# Altium footprint library Supernova.PcbLib: 77 footprints (part 4 of 6)
Each footprint in its own frame and in the unit in brackets; x right, y up, seen from the top. Pads: shape width x height; smd on the part's side, far side on the other; paste and mask are expansions set on the pad; w line width, h text height; cw(c..) or ccw(c..) is an arc to the next point about the centre after c.
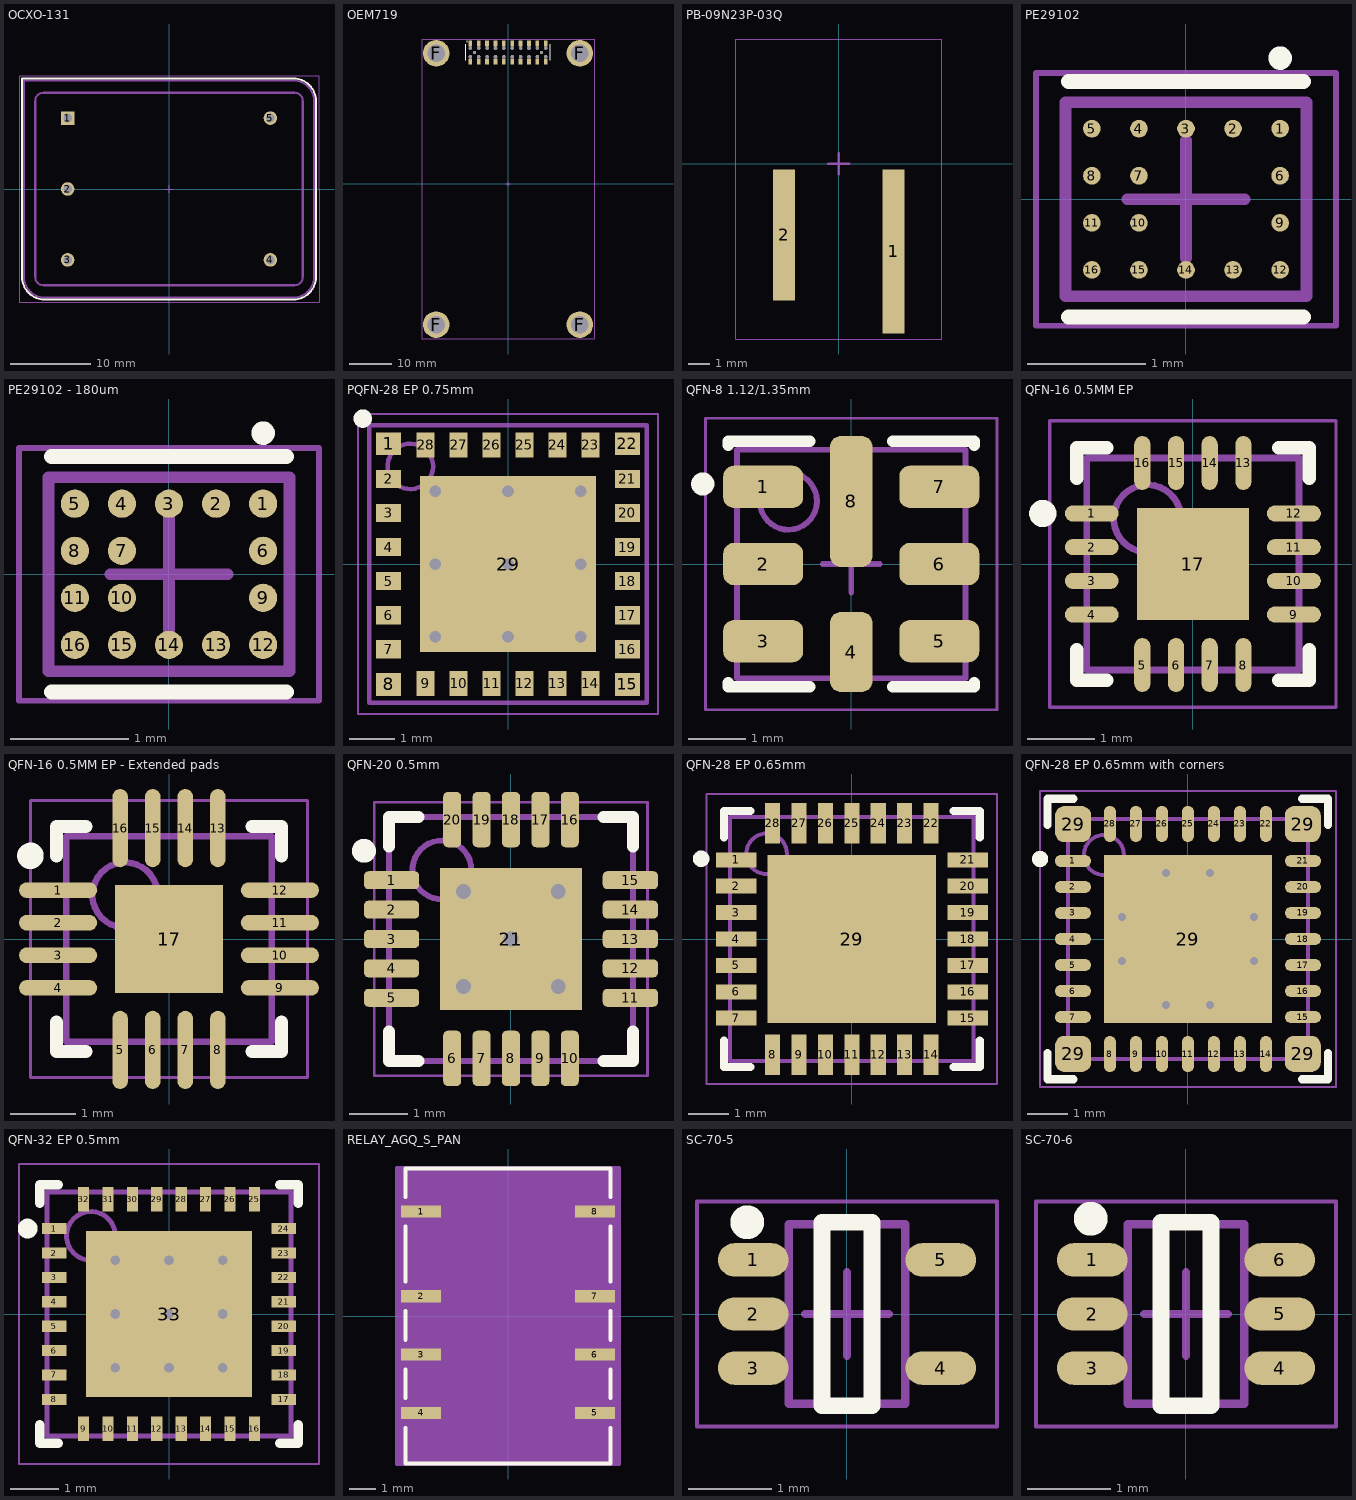
[diagram p3: the footprints below, top view; thin cyan lines are the x and y axes]

## OCXO-131 [mm]
pads (5):
  rect 1.7x1.7 hole 1.1: 1(-12.7,8.89)
  round 1.7 hole 1.1: 2(-12.7,0) 3(-12.7,-8.89) 4(12.7,-8.89) 5(12.7,8.89)
Top Overlay:
  lines w0.254: -18.415,-11.049 ccw(c-15.621,-11.049) -15.621,-13.843 15.621,-13.843 ccw(c15.621,-11.049) 18.415,-11.049 18.415,11.049 ccw(c15.621,11.049) 15.621,13.843 -18.415,13.843 -18.415,-11.049
Top 3D Body:
  lines w0.254: -18.161,-11.049 ccw(c-15.621,-11.049) -15.621,-13.589 15.621,-13.589 ccw(c15.621,-11.049) 18.161,-11.049 18.161,11.049 ccw(c15.621,11.049) 15.621,13.589 -18.161,13.589 -18.161,-11.049 ; -16.764,-11.049 ccw(c-15.748,-11.049) -15.748,-12.065 15.748,-12.065 ccw(c15.748,-11.049) 16.764,-11.049 16.764,11.049 ccw(c15.748,11.049) 15.748,12.065 -15.748,12.065 ccw(c-15.748,11.049) -16.764,11.049 -16.764,-11.049
Top Courtyard:
  lines w0.05: -18.8,-14.2 18.8,-14.2 18.8,14.2 -18.8,14.2 -18.8,-14.2
  lines w0.1: -0.48,0 0.48,0 ; 0,-0.48 0,0.48
3D body: height 0, standoff -5.08, extent 12.309,8.497 13.094,9.283
3D body: height 0, standoff -5.08, extent 12.309,-9.283 13.094,-8.497
3D body: height 0, standoff -5.08, extent -13.091,-9.283 -12.306,-8.497
3D body: height 0, standoff -5.08, extent -13.091,-0.393 -12.306,0.393
3D body: height 0, standoff -5.08, extent -13.091,8.497 -12.306,9.283
3D body: height 19.05, standoff 1.42, extent -16.763,-12.064 16.763,12.064
3D body: height 1.42, standoff 0.76, extent -18.162,-13.59 18.162,13.59

## OEM719 [mil]
pads (46):
  rect 35x55 smd: 1(-353.92,1321.53) 2(-353.92,1151.53) 3(-275.22,1321.53) 4(-275.22,1151.53) 5(-196.52,1321.53) 6(-196.52,1151.53) 7(-117.82,1321.53) 8(-117.82,1151.53) 9(-39.12,1321.53) 10(-39.12,1151.53) 11(39.58,1321.53) 12(39.58,1151.53) 13(118.28,1321.53) 14(118.28,1151.53) 15(196.98,1321.53) 16(196.98,1151.53) 17(275.68,1321.53) 18(275.68,1151.53) 19(354.38,1321.53) 20(354.38,1151.53)
  round 250 hole 165: F(-675,-1321.53) F(-674,1228.47) F(675,-1321.53) F(675,1228.47)
  round 30 hole 34 unplated: ""(-353.92,1197.15) ""(-353.92,1275.9) ""(-275.22,1197.15) ""(-275.22,1275.9) ""(-196.52,1197.15) ""(-196.52,1275.9) ""(-117.82,1197.15) ""(-117.82,1275.9) ""(-39.12,1197.15) ""(-39.12,1275.9) ""(39.58,1197.15) ""(39.58,1275.9) ""(118.28,1197.15) ""(118.28,1275.9) ""(196.98,1197.15) ""(196.98,1275.9) ""(275.68,1197.15) ""(275.68,1275.9) ""(354.38,1197.15) ""(354.38,1275.9)
  round 30 hole 30: ""(-314.57,1236.53) ""(315.03,1236.53)
Top Overlay:
  circle w8: c-385.71,1338.6 r4
  lines w10: -397.64,1161.42 -397.64,1311.02 ; 398.09,1162.03 398.09,1311.64
Top Courtyard:
  lines w1.97: -811.02,-1456.69 -811.02,1362.2 811.02,1362.2 811.02,-1456.69 -811.02,-1456.69
  lines w3.94: -18.9,0 18.9,0 ; 0,-18.9 0,18.9
3D body "CLT-110-02-X-D.step": height 87.44, standoff -1.06, extent -392.62,1134.03 394.38,1337.03

## PB-09N23P-03Q [mm]
pads (2):
  rect 1x7.5 smd paste-2: 1(2.5,-4)
  rect 1x6 smd paste-2: 2(-2.5,-3.25)
Top Courtyard:
  lines w0.05: -4.7,-8 4.7,-8 4.7,5.7 -4.7,5.7 -4.7,-8
  lines w0.1: -0.48,0 0.48,0 ; 0,-0.48 0,0.48
3D body: height 0.6, standoff 0, extent 2.202,-7.5 2.8,0
3D body: height 0.6, standoff 0, extent -2.799,-6 -2.201,0
3D body: height 4.8, standoff -4.2, extent -4.5,0 4.5,5.5

## PE29102 [mm] "BGA, 16-Leads, Body 2.05x1.65mmx0.20mm, Pitch 0.40mm"
height 0.2
pads (16):
  round 0.15 smd mask-0.03: 1(0.8,0.6) 2(0.4,0.6) 3(0,0.6) 4(-0.4,0.6) 5(-0.8,0.6) 6(0.8,0.2) 7(-0.4,0.2) 8(-0.8,0.2) 9(0.8,-0.2) 10(-0.4,-0.2) 11(-0.8,-0.2) 12(0.8,-0.6) 13(0.4,-0.6) 14(0,-0.6) 15(-0.4,-0.6) 16(-0.8,-0.6)
Top Overlay:
  circle w0.1: c0.8,1.2 r0.05
  lines w0.127: -1,-1 1,-1 ; -1,1 1,1
Top 3D Body:
  lines w0.1: -1.025,-0.825 -1.025,0.825 1.025,0.825 1.025,-0.825 -1.025,-0.825
Top Courtyard:
  lines w0.05: -1.275,-1.075 -1.275,1.075 1.275,1.075 1.275,-1.075 -1.275,-1.075
  lines w0.1: -0.5,0 0.5,0 ; 0,-0.5 0,0.5
3D body: height 0.2, standoff 0.07, extent -1.025,-0.825 1.025,0.825

## PE29102 - 180um [mm] "BGA, 16-Leads, Body 2.05x1.65mmx0.20mm, Pitch 0.40mm"
height 0.2
pads (16):
  round 0.24 smd paste-0.03 mask-0.03: 1(0.8,0.6) 2(0.4,0.6) 3(0,0.6) 4(-0.4,0.6) 5(-0.8,0.6) 6(0.8,0.2) 7(-0.4,0.2) 8(-0.8,0.2) 9(0.8,-0.2) 10(-0.4,-0.2) 11(-0.8,-0.2) 12(0.8,-0.6) 13(0.4,-0.6) 14(0,-0.6) 15(-0.4,-0.6) 16(-0.8,-0.6)
Top Overlay:
  circle w0.1: c0.8,1.2 r0.05
  lines w0.127: -1,-1 1,-1 ; -1,1 1,1
Top 3D Body:
  lines w0.1: -1.025,-0.825 1.025,-0.825 1.025,0.825 -1.025,0.825 -1.025,-0.825
Top Courtyard:
  lines w0.05: -1.275,-1.075 1.275,-1.075 1.275,1.075 -1.275,1.075 -1.275,-1.075
  lines w0.1: -0.5,0 0.5,0 ; 0,-0.5 0,0.5
3D body: height 0.2, standoff 0.07, extent -1.025,-0.825 1.025,0.825

## PQFN-28 EP 0.75mm [mm] "PQFN, 28-Leads, Body 6.00x6.00mm, Pitch 0.75mm, Thermal Pad 2.30x2.30mm, IPC Medium Density"
height 1.05
pads (29):
  rect 0.55x0.5 smd paste-0.02 mask+0.05: 1(-2.625,2.65) 8(-2.625,-2.65) 15(2.625,-2.65) 22(2.625,2.65)
  rect 0.55x0.4 smd paste-0.02 mask+0.065: 2(-2.625,1.875) 3(-2.625,1.125) 4(-2.625,0.375) 5(-2.625,-0.375) 6(-2.625,-1.125) 7(-2.625,-1.875) 16(2.625,-1.875) 17(2.625,-1.125) 18(2.625,-0.375) 19(2.625,0.375) 20(2.625,1.125) 21(2.625,1.875)
  rect 0.4x0.55 smd paste-0.02 mask+0.065: 9(-1.813,-2.625) 10(-1.088,-2.625) 11(-0.363,-2.625) 12(0.363,-2.625) 13(1.088,-2.625) 14(1.813,-2.625) 23(1.813,2.625) 24(1.088,2.625) 25(0.363,2.625) 26(-0.363,2.625) 27(-1.088,2.625) 28(-1.813,2.625)
  rect 3.875x3.875 smd paste-2 mask+0.065: 29(0,0)
via 0,1.6 diameter 0.508 hole 0.254
via -1.6,1.6 diameter 0.508 hole 0.254
via -1.6,0 diameter 0.508 hole 0.254
via -1.6,-1.6 diameter 0.508 hole 0.254
via 0,-1.6 diameter 0.508 hole 0.254
via 1.6,-1.6 diameter 0.508 hole 0.254
via 0,0 diameter 0.508 hole 0.254
via 1.6,0 diameter 0.508 hole 0.254
via 1.6,1.6 diameter 0.508 hole 0.254
Top Overlay:
  circle w0.203: c-3.197,3.2 r0.102
Top Paste:
  region: -0.1,-0.9 -0.1,-0.979 -0.131,-1.133 -0.191,-1.279 -0.279,-1.41 -0.39,-1.521 -0.521,-1.609 -0.667,-1.669 -0.821,-1.7 -0.9,-1.7 -0.979,-1.7 -1.133,-1.669 -1.279,-1.609 -1.41,-1.521 -1.521,-1.41 -1.609,-1.279 -1.669,-1.133 -1.7,-0.979 -1.7,-0.9 -1.7,-0.821 -1.669,-0.667 -1.609,-0.521 -1.521,-0.39 -1.41,-0.279 -1.279,-0.191 -1.133,-0.131 -0.979,-0.1 -0.9,-0.1 -0.821,-0.1 -0.667,-0.131 -0.521,-0.191 -0.39,-0.279 -0.279,-0.39 -0.191,-0.521 -0.131,-0.667 -0.1,-0.821
  region: 0.9,-0.1 0.979,-0.1 1.133,-0.131 1.279,-0.191 1.41,-0.279 1.521,-0.39 1.609,-0.521 1.669,-0.667 1.7,-0.821 1.7,-0.9 1.7,-0.979 1.669,-1.133 1.609,-1.279 1.521,-1.41 1.41,-1.521 1.279,-1.609 1.133,-1.669 0.979,-1.7 0.9,-1.7 0.821,-1.7 0.667,-1.669 0.521,-1.609 0.39,-1.521 0.279,-1.41 0.191,-1.279 0.131,-1.133 0.1,-0.979 0.1,-0.9 0.1,-0.821 0.131,-0.667 0.191,-0.521 0.279,-0.39 0.39,-0.279 0.521,-0.191 0.667,-0.131 0.821,-0.1
  region: 0.1,0.9 0.1,0.979 0.131,1.133 0.191,1.279 0.279,1.41 0.39,1.521 0.521,1.609 0.667,1.669 0.821,1.7 0.9,1.7 0.979,1.7 1.133,1.669 1.279,1.609 1.41,1.521 1.521,1.41 1.609,1.279 1.669,1.133 1.7,0.979 1.7,0.9 1.7,0.821 1.669,0.667 1.609,0.521 1.521,0.39 1.41,0.279 1.279,0.191 1.133,0.131 0.979,0.1 0.9,0.1 0.821,0.1 0.667,0.131 0.521,0.191 0.39,0.279 0.279,0.39 0.191,0.521 0.131,0.667 0.1,0.821
  region: -0.9,0.1 -0.979,0.1 -1.133,0.131 -1.279,0.191 -1.41,0.279 -1.521,0.39 -1.609,0.521 -1.669,0.667 -1.7,0.821 -1.7,0.9 -1.7,0.979 -1.669,1.133 -1.609,1.279 -1.521,1.41 -1.41,1.521 -1.279,1.609 -1.133,1.669 -0.979,1.7 -0.9,1.7 -0.821,1.7 -0.667,1.669 -0.521,1.609 -0.39,1.521 -0.279,1.41 -0.191,1.279 -0.131,1.133 -0.1,0.979 -0.1,0.9 -0.1,0.821 -0.131,0.667 -0.191,0.521 -0.279,0.39 -0.39,0.279 -0.521,0.191 -0.667,0.131 -0.821,0.1
Top Solder:
  rectangle: -2,-2 2,2
  rectangle: 0.25,-2 1.35,2
  region: 2,0.25 2,1.35 -2,1.35 -2,0.25
  region: -0.25,2 -1.35,2 -1.35,-2 -0.25,-2
  region: -2,-0.25 -2,-1.35 2,-1.35 2,-0.25
Top 3D Body:
  circle w0.1: c-2.15,2.15 r0.5
  lines w0.1: -3.05,-3.05 3.05,-3.05 3.05,3.05 -3.05,3.05 -3.05,-3.05
Top Courtyard:
  lines w0.05: -3.3,-3.3 3.3,-3.3 3.3,3.3 -3.3,3.3 -3.3,-3.3
  lines w0.1: -0.5,0 0.5,0 ; 0,-0.5 0,0.5
3D body: height 1.05, standoff 0, extent -3.05,-3.05 3.05,3.05

## QFN-8 1.12/1.35mm [mm] "QFN, 8-Leads, Body 3.80x3.80mm, Pitch 1.12mm/1.35mm, IPC Medium Density"
height 1.1
pads (8):
  rrect50% 1.4x0.74 smd: 1(-1.54,1.35) 2(-1.54,0) 3(-1.54,-1.35) 5(1.54,-1.35) 6(1.54,0) 7(1.54,1.35)
  rrect50% 0.74x1.4 smd: 4(0,-1.54)
  rrect50% 0.74x2.29 smd: 8(0,1.095)
Top Overlay:
  circle w0.203: c-2.597,1.4 r0.102
  lines w0.2: -2.15,-2.075 -2.15,-2.15 -0.725,-2.15 ; -2.15,2.075 -2.15,2.15 -0.725,2.15 ; 0.725,-2.15 2.15,-2.15 2.15,-2.075 ; 0.725,2.15 2.15,2.15 2.15,2.075
Top 3D Body:
  circle w0.1: c-1.1,1.1 r0.5
  lines w0.1: -2,-2 2,-2 2,2 -2,2 -2,-2
Top Courtyard:
  lines w0.05: -2.55,-2.55 2.55,-2.55 2.55,2.55 -2.55,2.55 -2.55,-2.55
  lines w0.1: -0.5,0 0.5,0 ; 0,-0.5 0,0.5
3D body: height 1.1, standoff 0.01, extent -2,-2 2,2

## QFN-16 0.5MM EP [mm] "QFN, 16-Leads, Body 3.00x3.00mm, Pitch 0.50mm, Thermal Pad 1.66x1.66mm, IPC Medium Density"
height 0.8
pads (17):
  oval 0.8x0.24 smd mask+0.025: 1(-1.5,0.75) 2(-1.5,0.25) 3(-1.5,-0.25) 4(-1.5,-0.75) 9(1.5,-0.75) 10(1.5,-0.25) 11(1.5,0.25) 12(1.5,0.75)
  oval 0.24x0.8 smd mask+0.025: 5(-0.75,-1.5) 6(-0.25,-1.5) 7(0.25,-1.5) 8(0.75,-1.5) 13(0.75,1.5) 14(0.25,1.5) 15(-0.25,1.5) 16(-0.75,1.5)
  rect 1.66x1.66 smd paste-0.1 mask+0.025: 17(0,0)
Top Overlay:
  circle w0.203: c-2.227,0.75 r0.102
  lines w0.2: -1.725,-1.275 -1.725,-1.725 -1.275,-1.725 ; -1.725,1.275 -1.725,1.725 -1.275,1.725 ; 1.275,-1.725 1.725,-1.725 1.725,-1.275 ; 1.275,1.725 1.725,1.725 1.725,1.275
Top 3D Body:
  circle w0.1: c-0.675,0.675 r0.5
  lines w0.1: -1.575,-1.575 -1.575,1.575 1.575,1.575 1.575,-1.575 -1.575,-1.575
Top Courtyard:
  lines w0.05: -2.125,-2.125 -2.125,2.125 2.125,2.125 2.125,-2.125 -2.125,-2.125
  lines w0.1: -0.5,0 0.5,0 ; 0,-0.5 0,0.5
3D body: height 0.8, standoff 0, extent -1.575,-1.575 1.575,1.575

## QFN-16 0.5MM EP - Extended pads [mm] "QFN, 16-Leads, Body 3.00x3.00mm, Pitch 0.50mm, Thermal Pad 1.66x1.66mm, IPC Medium Density"
height 0.8
pads (17):
  oval 1.2x0.24 smd mask+0.025: 1(-1.7,0.75) 2(-1.7,0.25) 3(-1.7,-0.25) 4(-1.7,-0.75) 9(1.7,-0.75) 10(1.7,-0.25) 11(1.7,0.25) 12(1.7,0.75)
  oval 0.24x1.2 smd mask+0.025: 5(-0.75,-1.7) 6(-0.25,-1.7) 7(0.25,-1.7) 8(0.75,-1.7) 13(0.75,1.7) 14(0.25,1.7) 15(-0.25,1.7) 16(-0.75,1.7)
  rect 1.66x1.66 smd paste-0.1 mask+0.025: 17(0,0)
Top Overlay:
  circle w0.203: c-2.125,1.275 r0.102
  lines w0.2: -1.725,-1.275 -1.725,-1.725 -1.275,-1.725 ; -1.725,1.275 -1.725,1.725 -1.275,1.725 ; 1.275,-1.725 1.725,-1.725 1.725,-1.275 ; 1.275,1.725 1.725,1.725 1.725,1.275
Top 3D Body:
  circle w0.1: c-0.675,0.675 r0.5
  lines w0.1: -1.575,-1.575 -1.575,1.575 1.575,1.575 1.575,-1.575 -1.575,-1.575
Top Courtyard:
  lines w0.05: -2.125,-2.125 -2.125,2.125 2.125,2.125 2.125,-2.125 -2.125,-2.125
  lines w0.1: -0.5,0 0.5,0 ; 0,-0.5 0,0.5
3D body: height 0.8, standoff 0, extent -1.575,-1.575 1.575,1.575

## QFN-20 0.5mm [mil] "PQFN, 20-Leads, Body 4.00x4.00mm, Pitch 0.50mm, Thermal Pad 2.30x2.30mm, IPC Medium Density"
height 39.37
pads (21):
  rrect50% 37x12 smd mask+1: 1(-79.92,39.37) 2(-79.92,19.68) 3(-79.92,0) 4(-79.92,-19.69) 5(-79.92,-39.37) 11(79.92,-39.37) 12(79.92,-19.69) 13(79.92,0) 14(79.92,19.68) 15(79.92,39.37)
  rrect50% 12x37 smd mask+1: 6(-39.37,-79.92) 7(-19.68,-79.92) 8(0,-79.92) 9(19.69,-79.92) 10(39.37,-79.92) 16(39.37,79.92) 17(19.69,79.92) 18(0,79.92) 19(-19.68,79.92) 20(-39.37,79.92)
  rect 95x95 smd paste-50 mask+1: 21(0,0)
via -31.66,31.66 diameter 20 hole 10
via 31.66,31.66 diameter 20 hole 10
via -31.66,-31.66 diameter 20 hole 10
via 31.66,-31.66 diameter 20 hole 10
via 0,0 diameter 20 hole 10
Top Overlay:
  circle w8: c-98.43,59.06 r4
  lines w7.87: -81.69,-62.01 -81.69,-81.69 -62.01,-81.69 ; -81.69,62.01 -81.69,81.69 -62.01,81.69 ; 62.01,-81.69 81.69,-81.69 81.69,-62.01 ; 62.01,81.69 81.69,81.69 81.69,62.01
Top Paste:
  region: -43.31,19.68 -23.62,19.68 -11.81,7.87 -11.81,-7.87 -23.62,-19.68 -43.31,-19.68
  region: -19.68,-43.31 -19.68,-23.62 -7.87,-11.81 7.87,-11.81 19.68,-23.62 19.68,-43.31
  region: 43.31,-19.68 23.62,-19.68 11.81,-7.87 11.81,7.87 23.62,19.68 43.31,19.68
  region: 19.68,43.31 19.68,23.62 7.87,11.81 -7.87,11.81 -19.68,23.62 -19.68,43.31
Top Solder:
  rectangle: 14.66,-16 48.66,16
  region: 16,14.66 16,48.66 -16,48.66 -16,14.66
  region: -14.66,16 -48.66,16 -48.66,-16 -14.66,-16
  region: -16,-14.66 -16,-48.66 16,-48.66 16,-14.66
Top 3D Body:
  circle w3.94: c-46.26,46.26 r19.68
  lines w3.94: -81.69,-81.69 -81.69,81.69 81.69,81.69 81.69,-81.69 -81.69,-81.69
Top Courtyard:
  lines w1.97: -91.54,-91.54 -91.54,91.54 91.54,91.54 91.54,-91.54 -91.54,-91.54
  lines w3.94: -19.68,0 19.69,0 ; 0,-19.69 0,19.68
3D body: height 39.37, standoff 0, extent -81.69,-81.69 81.69,81.69

## QFN-28 EP 0.65mm [mm] "QFN, 28-Leads, Body 6.00x6.00mm, Pitch 0.65mm, Thermal Pad 3.93x3.93mm, IPC Medium Density"
height 1
pads (29):
  rect 1x0.37 smd mask+0.025: 1(-2.85,1.95) 2(-2.85,1.3) 3(-2.85,0.65) 4(-2.85,0) 5(-2.85,-0.65) 6(-2.85,-1.3) 7(-2.85,-1.95) 15(2.85,-1.95) 16(2.85,-1.3) 17(2.85,-0.65) 18(2.85,0) 19(2.85,0.65) 20(2.85,1.3) 21(2.85,1.95)
  rect 0.37x1 smd mask+0.025: 8(-1.95,-2.85) 9(-1.3,-2.85) 10(-0.65,-2.85) 11(0,-2.85) 12(0.65,-2.85) 13(1.3,-2.85) 14(1.95,-2.85) 22(1.95,2.85) 23(1.3,2.85) 24(0.65,2.85) 25(0,2.85) 26(-0.65,2.85) 27(-1.3,2.85) 28(-1.95,2.85)
  rect 4.15x4.15 smd paste-3 mask+0.025: 29(0,0)
Top Overlay:
  circle w0.203: c-3.713,1.976 r0.102
  lines w0.2: -3.15,-2.5 -3.15,-3.15 -2.5,-3.15 ; -3.15,2.5 -3.15,3.15 -2.5,3.15 ; 2.5,-3.15 3.15,-3.15 3.15,-2.5 ; 2.5,3.15 3.15,3.15 3.15,2.5
Top Paste:
  rectangle: 0.151,0.151 1.851,1.851
  region: -0.151,0.151 -0.151,1.851 -1.851,1.851 -1.851,0.151
  region: -0.151,-0.151 -1.851,-0.151 -1.851,-1.851 -0.151,-1.851
  region: 0.151,-0.151 0.151,-1.851 1.851,-1.851 1.851,-0.151
Top 3D Body:
  circle w0.1: c-2.1,2.1 r0.5
  lines w0.1: -3,-3 -3,3 3,3 3,-3 -3,-3
Top Courtyard:
  lines w0.05: -3.575,-3.575 -3.575,3.575 3.575,3.575 3.575,-3.575 -3.575,-3.575
  lines w0.1: -0.5,0 0.5,0 ; 0,-0.5 0,0.5
3D body: height 1, standoff 0, extent -3,-3 3,3

## QFN-28 EP 0.65mm with corners [mm] "QFN, 28-Leads, Body 6.00x6.00mm, Pitch 0.65mm, Thermal Pad 4.20x4.20mm, IPC Medium Density"
height 1
pads (33):
  oval 0.9x0.3 smd mask+0.051: 1(-2.875,1.95) 2(-2.875,1.3) 3(-2.875,0.65) 4(-2.875,0) 5(-2.875,-0.65) 6(-2.875,-1.3) 7(-2.875,-1.95) 15(2.875,-1.95) 16(2.875,-1.3) 17(2.875,-0.65) 18(2.875,0) 19(2.875,0.65) 20(2.875,1.3) 21(2.875,1.95)
  oval 0.3x0.9 smd mask+0.051: 8(-1.95,-2.875) 9(-1.3,-2.875) 10(-0.65,-2.875) 11(0,-2.875) 12(0.65,-2.875) 13(1.3,-2.875) 14(1.95,-2.875) 22(1.95,2.875) 23(1.3,2.875) 24(0.65,2.875) 25(0,2.875) 26(-0.65,2.875) 27(-1.3,2.875) 28(-1.95,2.875)
  rrect50% 0.9x0.9 smd paste-0.075 mask+0.051: 29(-2.87,-2.87) 29(-2.87,2.87) 29(2.87,-2.87) 29(2.87,2.87)
  rect 4.2x4.2 smd paste-3 mask+0.051: 29(0,0)
via 0.55,-1.65 diameter 0.5 hole 0.2
via -0.55,-1.65 diameter 0.5 hole 0.2
via 1.65,-0.55 diameter 0.5 hole 0.2
via -1.65,-0.55 diameter 0.5 hole 0.2
via 1.65,0.55 diameter 0.5 hole 0.2
via -1.65,0.55 diameter 0.5 hole 0.2
via 0.55,1.65 diameter 0.5 hole 0.2
via -0.55,1.65 diameter 0.5 hole 0.2
Top Overlay:
  circle w0.203: c-3.697,2 r0.102
  lines w0.2: -3.506,-2.856 -3.506,-3.506 -2.856,-3.506 ; -3.506,2.856 -3.506,3.506 -2.856,3.506 ; 2.856,-3.506 3.506,-3.506 3.506,-2.856 ; 2.856,3.506 3.506,3.506 3.506,2.856
Top Paste:
  region: 0,-1.487 -0.146,-1.487 -0.434,-1.429 -0.704,-1.317 -0.948,-1.155 -1.155,-0.948 -1.317,-0.704 -1.429,-0.434 -1.487,-0.146 -1.487,0 -1.487,0.146 -1.429,0.434 -1.317,0.704 -1.155,0.948 -0.948,1.155 -0.704,1.317 -0.434,1.429 -0.146,1.487 0,1.487 0.146,1.487 0.434,1.429 0.704,1.317 0.948,1.155 1.155,0.948 1.317,0.704 1.429,0.434 1.487,0.146 1.487,0 1.487,-0.146 1.429,-0.434 1.317,-0.704 1.155,-0.948 0.948,-1.155 0.704,-1.317 0.434,-1.429 0.146,-1.487
  region: -1.5,-2 -1.599,-2 -1.783,-1.924 -1.924,-1.783 -2,-1.599 -2,-1.5 -2,-1.401 -1.924,-1.217 -1.783,-1.076 -1.599,-1 -1.5,-1 -1.401,-1 -1.217,-1.076 -1.076,-1.217 -1,-1.401 -1,-1.5 -1,-1.599 -1.076,-1.783 -1.217,-1.924 -1.401,-2
  region: 2,-1.5 2,-1.599 1.924,-1.783 1.783,-1.924 1.599,-2 1.5,-2 1.401,-2 1.217,-1.924 1.076,-1.783 1,-1.599 1,-1.5 1,-1.401 1.076,-1.217 1.217,-1.076 1.401,-1 1.5,-1 1.599,-1 1.783,-1.076 1.924,-1.217 2,-1.401
  region: 1.5,2 1.599,2 1.783,1.924 1.924,1.783 2,1.599 2,1.5 2,1.401 1.924,1.217 1.783,1.076 1.599,1 1.5,1 1.401,1 1.217,1.076 1.076,1.217 1,1.401 1,1.5 1,1.599 1.076,1.783 1.217,1.924 1.401,2
  region: -2,1.5 -2,1.599 -1.924,1.783 -1.783,1.924 -1.599,2 -1.5,2 -1.401,2 -1.217,1.924 -1.076,1.783 -1,1.599 -1,1.5 -1,1.401 -1.076,1.217 -1.217,1.076 -1.401,1 -1.5,1 -1.599,1 -1.783,1.076 -1.924,1.217 -2,1.401
Top 3D Body:
  circle w0.1: c-2.1,2.1 r0.5
  lines w0.1: -3,-3 3,-3 3,3 -3,3 -3,-3
Top Courtyard:
  lines w0.05: -3.7,-3.7 3.7,-3.7 3.7,3.7 -3.7,3.7 -3.7,-3.7
  lines w0.1: -0.48,0 0.48,0 ; 0,-0.48 0,0.48
3D body: height 1, standoff 0.01, extent -3,-3 3,3

## QFN-32 EP 0.5mm [mm] "QFN, 32-Leads, Body 5.00x5.00mm, Pitch 0.50mm, Thermal Pad 3.10x3.10mm, IPC Medium Density"
height 1
pads (33):
  rect 0.5x0.23 smd mask+0.025: 1(-2.35,1.75) 2(-2.35,1.25) 3(-2.35,0.75) 4(-2.35,0.25) 5(-2.35,-0.25) 6(-2.35,-0.75) 7(-2.35,-1.25) 8(-2.35,-1.75) 17(2.35,-1.75) 18(2.35,-1.25) 19(2.35,-0.75) 20(2.35,-0.25) 21(2.35,0.25) 22(2.35,0.75) 23(2.35,1.25) 24(2.35,1.75)
  rect 0.23x0.5 smd mask+0.025: 9(-1.75,-2.35) 10(-1.25,-2.35) 11(-0.75,-2.35) 12(-0.25,-2.35) 13(0.25,-2.35) 14(0.75,-2.35) 15(1.25,-2.35) 16(1.75,-2.35) 25(1.75,2.35) 26(1.25,2.35) 27(0.75,2.35) 28(0.25,2.35) 29(-0.25,2.35) 30(-0.75,2.35) 31(-1.25,2.35) 32(-1.75,2.35)
  rect 3.4x3.4 smd paste-2: 33(0,0)
via -1.1,1.1 diameter 0.5 hole 0.2
via 0,1.1 diameter 0.5 hole 0.2
via 1.1,1.1 diameter 0.5 hole 0.2
via -1.1,0 diameter 0.5 hole 0.2
via 0,0 diameter 0.5 hole 0.2
via 1.1,0 diameter 0.5 hole 0.2
via -1.1,-1.1 diameter 0.5 hole 0.2
via 0,-1.1 diameter 0.5 hole 0.2
via 1.1,-1.1 diameter 0.5 hole 0.2
Top Overlay:
  circle w0.203: c-2.897,1.75 r0.102
  lines w0.2: -2.65,-2.275 -2.65,-2.65 -2.275,-2.65 ; -2.65,2.275 -2.65,2.65 -2.275,2.65 ; 2.275,-2.65 2.65,-2.65 2.65,-2.275 ; 2.275,2.65 2.65,2.65 2.65,2.275
Top Paste:
  rectangle: -0.475,-0.475 0.475,0.475
  rectangle: -0.475,0.675 0.475,1.625
  region: -0.675,-0.475 -0.675,0.475 -1.625,0.475 -1.625,-0.475
  region: 0.475,-0.675 -0.475,-0.675 -0.475,-1.625 0.475,-1.625
  region: 0.675,0.475 0.675,-0.475 1.625,-0.475 1.625,0.475
  rectangle: 0.675,0.675 1.625,1.625
  rectangle: -1.625,0.675 -0.675,1.625
  region: -0.675,-1.625 -0.675,-0.675 -1.625,-0.675 -1.625,-1.625
  region: 1.625,-0.675 0.675,-0.675 0.675,-1.625 1.625,-1.625
Top 3D Body:
  circle w0.1: c-1.6,1.6 r0.5
  lines w0.1: -2.5,-2.5 -2.5,2.5 2.5,2.5 2.5,-2.5 -2.5,-2.5
Top Courtyard:
  lines w0.05: -3.075,-3.075 -3.075,3.075 3.075,3.075 3.075,-3.075 -3.075,-3.075
  lines w0.1: -0.5,0 0.5,0 ; 0,-0.5 0,0.5
3D body: height 1, standoff 0, extent -2.5,-2.5 2.5,2.5

## RELAY_AGQ_S_PAN [mil]
pads (8):
  rect 59.81x18.03 smd paste+0 mask+0: 1(-129.41,155.5) 2(-129.41,29.5) 3(-129.41,-57.5) 4(-129.41,-144.5) 5(129.41,-144.5) 6(129.41,-57.5) 7(129.41,29.5) 8(129.41,155.5)
Top Overlay:
  lines w6: -152.5,-166.62 -152.5,-219.5 152.5,-219.5 152.5,-166.62 ; -152.5,-122.38 -152.5,-79.62 ; -152.5,-35.38 -152.5,7.38 ; -152.5,51.62 -152.5,133.38 ; -152.5,177.62 -152.5,219.5 152.5,219.5 152.5,177.62 ; 152.5,-122.38 152.5,-79.62 ; 152.5,-35.38 152.5,7.38 ; 152.5,51.62 152.5,133.38
Top 3D Body:
  lines w0: -12,214.5 ccw(c0,214.5) 12,214.5
  lines w1: -147.5,-214.5 -147.5,214.5 147.5,214.5 147.5,-214.5 -147.5,-214.5 ; -147.5,-154.5 -147.5,-134.5 -147.5,-154.5 ; -147.5,-67.5 -147.5,-47.5 -147.5,-67.5 ; -147.5,19.5 -147.5,39.5 -147.5,19.5 ; -147.5,145.5 -147.5,165.5 -147.5,145.5 ; 147.5,-154.5 147.5,-134.5 147.5,-154.5 ; 147.5,-67.5 147.5,-47.5 147.5,-67.5 ; 147.5,19.5 147.5,39.5 147.5,19.5 ; 147.5,145.5 147.5,165.5 147.5,145.5
Top Courtyard:
  region: 165.31,-220.5 -165.31,-220.5 -165.31,220.5 165.31,220.5
  lines w6: -165.31,-220.5 165.31,-220.5 165.31,220.5 -165.31,220.5 -165.31,-220.5

## SC-70-5 [mm] "SOT23, 5-Leads, Body 2.00x2.10mm, Pitch 0.65mm, IPC Medium Density"
height 1.1
pads (5):
  oval 0.85x0.4 smd mask+0.025: 1(-1.125,0.65) 2(-1.125,0) 3(-1.125,-0.65) 4(1.125,-0.65) 5(1.125,0.65)
Top Overlay:
  circle w0.203: c-1.197,1.1 r0.102
  lines w0.2: -0.3,-1.1 0.3,-1.1 0.3,1.1 -0.3,1.1 -0.3,-1.1
Top 3D Body:
  lines w0.1: -0.7,-1.075 -0.7,1.075 0.7,1.075 0.7,-1.075 -0.7,-1.075
Top Courtyard:
  lines w0.05: -1.8,-1.35 -1.8,1.35 1.8,1.35 1.8,-1.35 -1.8,-1.35
  lines w0.1: -0.5,0 0.5,0 ; 0,-0.5 0,0.5
3D body "User Library-SC70-5-1.step": height 0.95, standoff 0, extent -1.05,-1 1.05,1

## SC-70-6 [mm] "SOT23, 6-Leads, Body 2.00x2.10mm, Pitch 0.65mm, IPC Medium Density"
height 1.1
pads (6):
  oval 0.85x0.4 smd mask+0.025: 1(-1.125,0.65) 2(-1.125,0) 3(-1.125,-0.65) 4(1.125,-0.65) 5(1.125,0) 6(1.125,0.65)
Top Overlay:
  circle w0.203: c-1.143,1.143 r0.102
  lines w0.2: -0.3,-1.1 -0.3,1.1 0.3,1.1 0.3,-1.1 -0.3,-1.1
Top 3D Body:
  lines w0.1: -0.7,-1.075 0.7,-1.075 0.7,1.075 -0.7,1.075 -0.7,-1.075
Top Courtyard:
  lines w0.05: -1.8,-1.35 1.8,-1.35 1.8,1.35 -1.8,1.35 -1.8,-1.35
  lines w0.1: -0.5,0 0.5,0 ; 0,-0.5 0,0.5
3D body: height 0.2, standoff 0, extent -1.27,-0.828 1.27,-0.491
3D body: height 0.2, standoff 0, extent -1.27,-0.178 1.27,0.159
3D body: height 0.2, standoff 0, extent -1.27,0.472 1.27,0.809
3D body: height 1.1, standoff 0.05, extent -0.7,-1.075 0.7,1.075